# Altium footprint library myPcb.PcbLib: 145 footprints (part 5 of 10)
Each footprint in its own frame and in the unit in brackets; x right, y up, seen from the top. Pads: shape width x height; smd on the part's side, far side on the other; paste and mask are expansions set on the pad; w line width, h text height; cw(c..) or ccw(c..) is an arc to the next point about the centre after c.
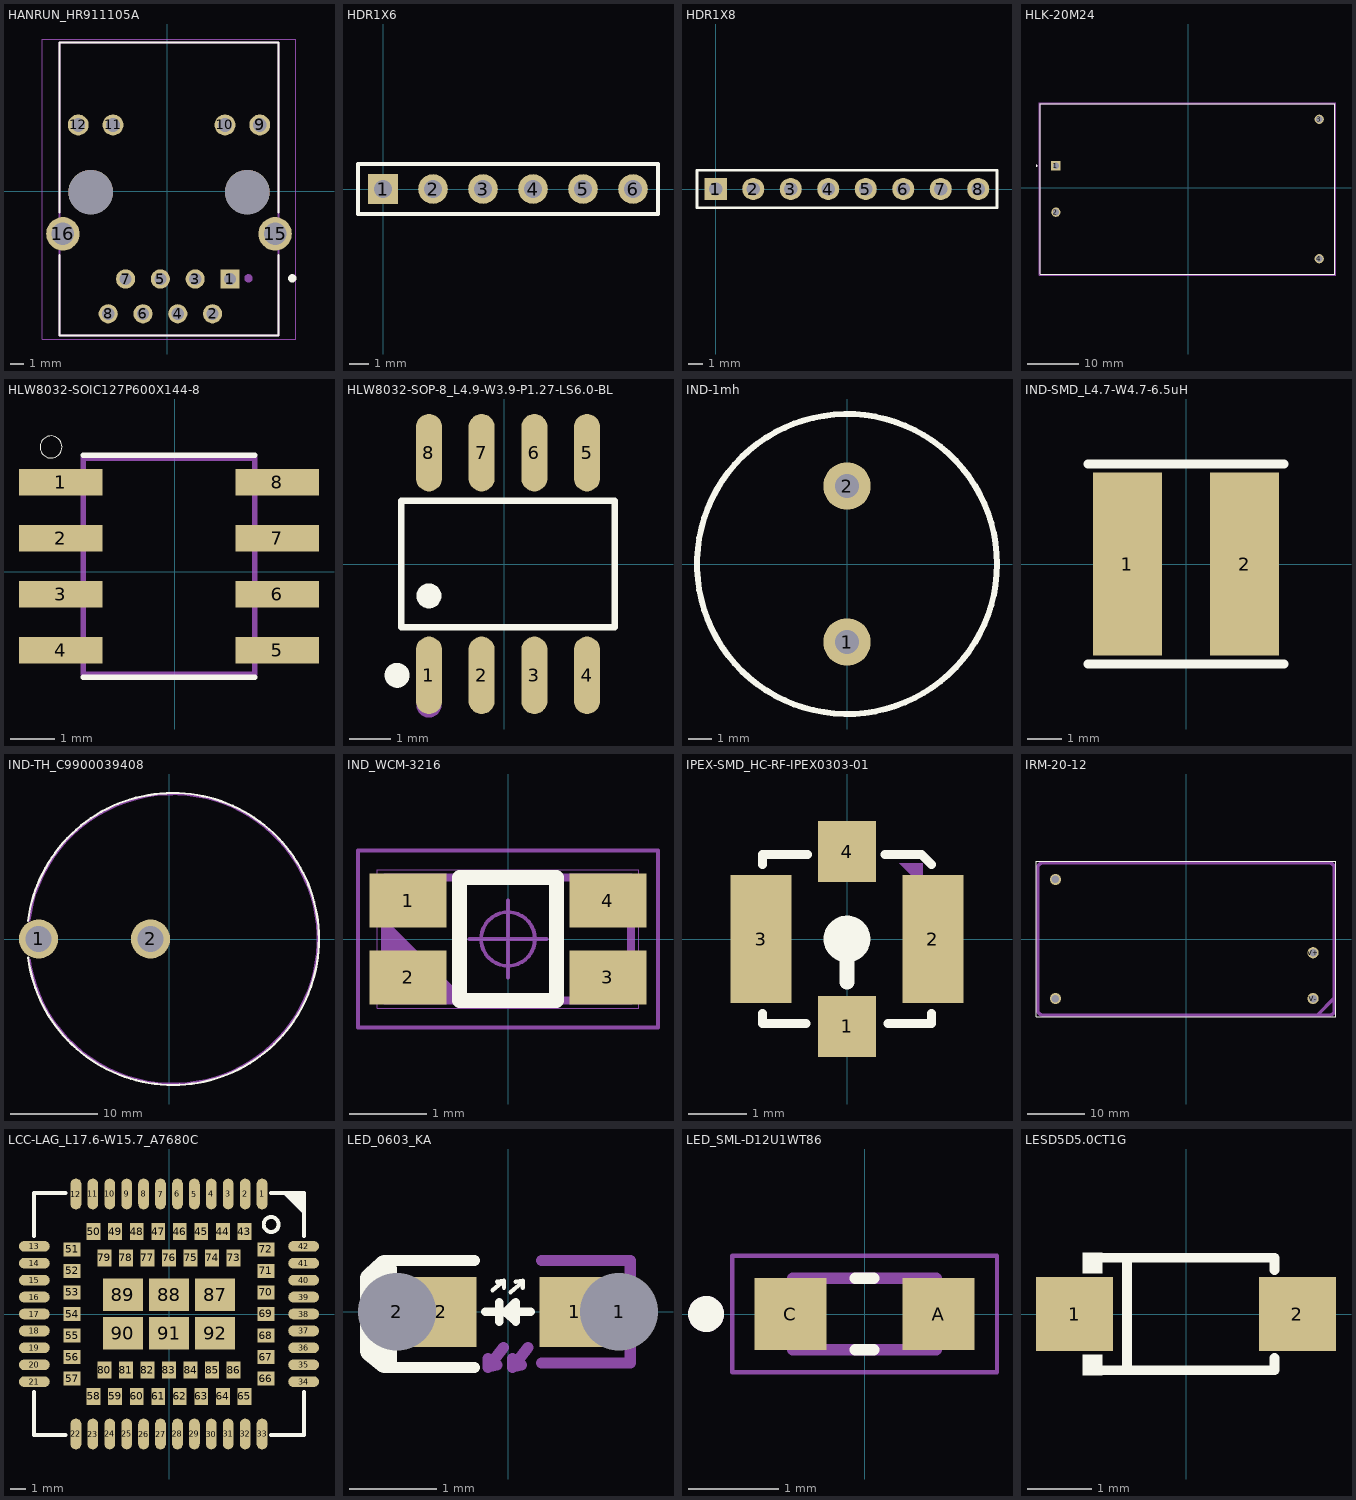
[diagram p4: the footprints below, top view; thin cyan lines are the x and y axes]

## HANRUN_HR911105A [mm] "带变压器以太网接口Hanrun"
pads (16):
  rect 1.398x1.398 / inner round 1.398 / far side rect 1.398x1.398 hole 0.89: 1(4.577,-6.393)
  round 1.398 hole 0.89: 2(3.307,-8.933) 3(2.037,-6.393) 4(0.767,-8.933) 5(-0.503,-6.393) 6(-1.773,-8.933) 7(-3.043,-6.393) 8(-4.313,-8.933)
  round 1.53 hole 1.02: 9(6.752,4.857) 10(4.212,4.857) 11(-3.958,4.857) 12(-6.498,4.857)
  round 2.445 hole 1.63: 15(7.872,-3.093) 16(-7.618,-3.093)
  round 3.25 hole 3.25 unplated: ""(-5.588,-0.043) ""(5.842,-0.043)
Top Overlay:
  circle w0.3: c9.127,-6.343 r0.15
  lines w0.127: -7.873,-4.643 -7.873,-10.523 8.127,-10.523 8.127,-4.643 ; -7.873,-1.543 -7.873,10.877 8.127,10.877 8.127,-1.543
Mechanical 13:
  circle w0.3: c5.927,-6.343 r0.15
  lines w0.127: -7.873,-10.523 8.127,-10.523 8.127,10.877 -7.873,10.877 -7.873,-10.523
Mechanical 15:
  lines w0.05: -9.123,-10.773 9.377,-10.773 9.377,11.127 -9.123,11.127 -9.123,-10.773

## HDR1X6 [mm] "Connector; Header; 6 Position,2.54mm"
pads (6):
  rect 1.5x1.5 hole 0.9: 1(0,0)
  round 1.5 hole 0.9: 2(2.54,0) 3(5.08,0) 4(7.62,0) 5(10.16,0) 6(12.7,0)
Top Overlay:
  lines w0.2: -1.27,-1.27 13.97,-1.27 13.97,1.27 -1.27,1.27 -1.27,-1.27

## HDR1X8 [mm] "Connector; Header; 8 Position,2.54mm"
pads (8):
  rect 1.5x1.5 hole 0.9: 1(0,0)
  round 1.5 hole 0.9: 2(2.54,0) 3(5.08,0) 4(7.62,0) 5(10.16,0) 6(12.7,0) 7(15.24,0) 8(17.78,0)
Top Overlay:
  lines w0.2: -1.27,-1.27 -1.27,1.27 19.05,1.27 19.05,-1.27 -1.27,-1.27

## HLK-20M24 [mm] "AC-DC Power Module"
pads (4):
  rect 1.8x1.8 hole 1.2: 1(-25.627,4.246)
  round 1.8 hole 1.2: 2(-25.627,-4.754) 3(25.373,13.246) 4(25.373,-13.754)
Top Overlay:
  circle w0.2: c-29.377,4.246 r0.1
  lines w0.127: -28.627,-16.754 -28.627,16.246 28.373,16.246 28.373,-16.754 -28.627,-16.754
Mechanical 13:
  circle w0.2: c-29.377,4.246 r0.1
  lines w0.127: -28.627,-16.754 -28.627,16.246 28.373,16.246 28.373,-16.754 -28.627,-16.754
Mechanical 15:
  lines w0.05: -28.877,-17.004 -28.877,16.496 28.623,16.496 28.623,-17.004 -28.877,-17.004
3D body "step_temp.STEP": height 22.5, standoff -5, extent -28.627,-16.754 28.373,16.246

## HLW8032-SOIC127P600X144-8 [mil] "HLW8032"
pads (8):
  rect 74.84x23.59 smd: 1(-101.67,80) 2(-101.67,30) 3(-101.67,-20) 4(-101.67,-70) 5(91.67,-70) 6(91.67,-20) 7(91.67,30) 8(91.67,80)
Top Overlay:
  circle w0: c-110.43,111.64 r9.84
  lines w4.72: -81.77,-94.16 71.77,-94.16 ; -81.77,104.16 71.77,104.16
Mechanical 13:
  lines w4.72: -81.77,-91.46 71.77,-91.46 71.77,101.46 -81.77,101.46 -81.77,-91.46

## HLW8032-SOP-8_L4.9-W3.9-P1.27-LS6.0-BL [mm] "HLW8032"
pads (8):
  oval 0.63x1.865 smd paste+0 mask+0.051: 1(-1.82,-2.682) 2(-0.55,-2.682) 3(0.72,-2.682) 4(1.99,-2.682) 5(1.99,2.682) 6(0.72,2.682) 7(-0.55,2.682) 8(-1.82,2.682)
Top Overlay:
  circle w0.3: c-2.587,-2.682 r0.15
  circle w0.3: c-1.82,-0.769 r0.15
  lines w0.152: -2.491,-1.521 2.661,-1.521 2.661,1.521 -2.491,1.521 -2.491,-1.521
Mechanical 15:
  circle w0.3: c-1.82,-3.4 r0.15

## IND-1mh [mm] "工字电感 1mh"
pads (2):
  round 2 hole 1 paste+0 mask+0.051: 1(0,-3.302) 2(0,3.302)
Top Overlay:
  circle w0.254: c0,0 r6.35

## IND-SMD_L4.7-W4.7-6.5uH [mm] "6.5uH"
pads (2):
  rect 2x5.3 smd paste+0 mask+0.051: 1(-1.7,0) 2(1.7,0)
Top Overlay:
  lines w0.254: -2.85,-2.9 2.85,-2.9 ; -2.85,2.9 2.85,2.9

## IND-TH_C9900039408 [mm] "1mh 0510 色环电感 立式安装"
pads (2):
  round 4.5 hole 3 paste+0 mask+0.05: 1(-14.973,0) 2(-2.123,0)
Top Overlay:
  lines w0.254: -16.181,2.079 cw(c0.452,0) -16.173,-2.147
Mechanical 15:
  drawing of 1 lines, arcs and shapes, not listed

## IND_WCM-3216 [mm] "WCM-3216-222T"
pads (4):
  rect 1x0.7 smd: 1(-1.3,0.5) 2(-1.3,-0.5) 3(1.3,-0.5) 4(1.3,0.5)
Top Overlay:
  lines w0.2: -0.63,-0.8 0.63,-0.8 0.63,0.8 -0.63,0.8 -0.63,-0.8
Top Assembly:
  lines w0.1: -1.6,-0.7 -1.5,-0.8 ; -1.6,-0.6 -1.4,-0.8 ; -1.6,-0.5 -1.3,-0.8 ; -1.6,-0.4 -1.2,-0.8 ; -1.6,-0.3 -1.1,-0.8 ; -1.6,-0.2 -1,-0.8 ; -1.6,-0.1 -0.9,-0.8 ; -1.6,0 -0.8,-0.8 ; -1.6,0.1 -0.7,-0.8 ; -1.6,0.2 -0.6,-0.8 ; -1.6,-0.8 1.6,-0.8 1.6,0.8 -1.6,0.8 -1.6,-0.8
Mechanical 18:
  circle w0.05: c0,0 r0.35
  lines w0.05: -0.5,0 0.5,0 ; 0,-0.5 0,0.5 ; -1.95,-1.15 1.95,-1.15 1.95,1.15 -1.95,1.15 -1.95,-1.15
Mechanical 19:
  lines w0.001: -1.7,-0.9 1.7,-0.9 1.7,0.9 -1.7,0.9 -1.7,-0.9

## IPEX-SMD_HC-RF-IPEX0303-01 [mm]
pads (4):
  rect 1x1.05 smd paste+0 mask+0.05: 1(0,-1.5) 4(0,1.5)
  rect 1.05x2.2 smd paste+0 mask+0.05: 2(1.475,0) 3(-1.475,0)
Top Overlay:
  circle w0.4: c0,0 r0.2
  lines w0.152: -1.45,-1.28 -1.45,-1.3 -1.45,-1.45 -0.701,-1.45 ; -1.45,1.28 -1.45,1.4 -1.45,1.45 -1.4,1.45 -0.68,1.45 ; 0.65,1.45 1.1,1.45 1.28,1.45 1.45,1.28 1.447,1.28 1.277,1.45 ; 0.701,-1.45 1.097,-1.45 1.45,-1.45 1.45,-1.3 1.45,-1.28
  lines w0.254: 0,-0.744 0,-0.3
Mechanical 15:
  circle w0.4: c0,-1.45 r0.2
  region: 1.3,0.9 1.3,1.3 0.9,1.3

## IRM-20-12 [mm]
pads (4):
  round 1.95 hole 1.3: AC/L(-22.8,10.4) AC/N(-22.8,-10.4) V+(22.2,-2.4) V-(22.2,-10.4)
Top Overlay:
  lines w0.127: -26.2,-13.6 26.2,-13.6 26.2,13.6 -26.2,13.6 -26.2,-13.6
Mechanical 13:
  lines w0.61: -25.9,-12.4 ccw(c-25,-12.4) -25,-13.3 ; -25.9,-12.4 ccw(c-25,-12.4) -25,-13.3 ; -25.9,-12.4 -25.9,12.4 ; -25.9,12.4 cw(c-25,12.4) -25,13.3 ; -25.9,12.4 cw(c-25,12.4) -25,13.3 ; -25,-13.3 22.9,-13.3 ; -25,13.3 25,13.3 ; 22.9,-13.3 25.1,-13.3 ; 22.9,-13.3 25.9,-10.3 ; 25,13.3 cw(c25,12.4) 25.9,12.4 ; 25,13.3 cw(c25,12.4) 25.9,12.4 ; 25.1,-13.3 ccw(c25.1,-12.5) 25.9,-12.5 ; 25.1,-13.3 ccw(c25.1,-12.5) 25.9,-12.5 ; 25.9,-12.5 25.9,-10.3 ; 25.9,-10.3 25.9,12.4

## LCC-LAG_L17.6-W15.7_A7680C [mm] "A7680C"
pads (92):
  oval 0.7x2 smd paste+0 mask+0.051: 1(6.05,7.8) 2(4.95,7.8) 3(3.85,7.8) 4(2.75,7.8) 5(1.65,7.8) 6(0.55,7.8) 7(-0.55,7.8) 8(-1.65,7.8) 9(-2.75,7.8) 10(-3.85,7.8) 11(-4.95,7.8) 12(-6.05,7.8) 22(-6.05,-7.8) 23(-4.95,-7.8) 24(-3.85,-7.8) 25(-2.75,-7.8) 26(-1.65,-7.8) 27(-0.55,-7.8) 28(0.55,-7.8) 29(1.65,-7.8) 30(2.75,-7.8) 31(3.85,-7.8) 32(4.95,-7.8) 33(6.05,-7.8)
  oval 2x0.7 smd paste+0 mask+0.051: 13(-8.75,4.4) 14(-8.75,3.3) 15(-8.75,2.2) 16(-8.75,1.1) 17(-8.75,0) 18(-8.75,-1.1) 19(-8.75,-2.2) 20(-8.75,-3.3) 21(-8.75,-4.4) 34(8.75,-4.4) 35(8.75,-3.3) 36(8.75,-2.2) 37(8.75,-1.1) 38(8.75,0) 39(8.75,1.1) 40(8.75,2.2) 41(8.75,3.3) 42(8.75,4.4)
  rect 0.9x1.1 smd paste+0 mask+0.051: 43(4.9,5.35) 44(3.5,5.35) 45(2.1,5.35) 46(0.7,5.35) 47(-0.7,5.35) 48(-2.1,5.35) 49(-3.5,5.35) 50(-4.9,5.35) 58(-4.9,-5.35) 59(-3.5,-5.35) 60(-2.1,-5.35) 61(-0.7,-5.35) 62(0.7,-5.35) 63(2.1,-5.35) 64(3.5,-5.35) 65(4.9,-5.35) 73(4.2,3.65) 74(2.8,3.65) 75(1.4,3.65) 76(0,3.65) 77(-1.4,3.65) 78(-2.8,3.65) 79(-4.2,3.65) 80(-4.2,-3.65) 81(-2.8,-3.65) 82(-1.4,-3.65) 83(0,-3.65) 84(1.4,-3.65) 85(2.8,-3.65) 86(4.2,-3.65)
  rect 1.1x0.9 smd paste+0 mask+0.051: 51(-6.3,4.2) 52(-6.3,2.8) 53(-6.3,1.4) 54(-6.3,0) 55(-6.3,-1.4) 56(-6.3,-2.8) 57(-6.3,-4.2) 66(6.3,-4.2) 67(6.3,-2.8) 68(6.3,-1.4) 69(6.3,0) 70(6.3,1.4) 71(6.3,2.8) 72(6.3,4.2)
  rect 2.6x2.1 smd paste+0 mask+0.051: 87(3,1.25) 88(0,1.25) 89(-3,1.25) 90(-3,-1.25) 91(0,-1.25) 92(3,-1.25)
Top Overlay:
  region: 8.763,6.477 8.763,7.874 7.366,7.874
  lines w0.254: -8.763,-5.08 -8.763,-7.874 -6.731,-7.874 ; -8.763,5.08 -8.763,7.874 -6.731,7.874 ; 6.631,-7.874 8.763,-7.874 8.763,-5.08 ; 6.631,7.874 8.763,7.874 8.763,5.08 ; 7.125,5.813 cw(c6.641,5.818) 7.125,5.818
Top Paste:
  region: 4.3,0.2 1.7,0.2 1.7,2.3 3.5,2.3 4.3,1.45
Top Solder:
  region: 4.3,0.2 1.7,0.2 1.7,2.3 3.5,2.3 4.3,1.45
Mechanical 1:
  region: 8.763,6.477 8.763,7.874 7.366,7.874

## LED_0603_KA [mil]
pads (4):
  rect 31.5x31.5 smd paste+0 mask+2: 1(30,0) 2(-30,0)
  round 30 hole 35 paste+0 mask+1.97: 1(50,0) 2(-50,0)
Top Overlay:
  lines w1.97: -7,9.67 -1.88,14 ; -4.97,13.57 -1.82,13.96 -1.82,10.81 ; 1.15,8.84 6.27,13.17 ; 3.51,13.57 6.66,13.96 6.66,10.81
  lines w3.94: -10.24,0 10.24,0 ; -3.94,-4.33 -3.94,4.33 ; -0.79,-0.39 3.54,-4.33 3.54,4.33 -0.39,0.39
  lines w5: -55,-25 -15,-25 ; -55,23 -15,23
  lines w10: -61.5,15 -61.5,-17.5 -55.5,-22.5 ; -61,15.5 -55.5,20.5 ; -55,-22 -55,19
Mechanical 6:
  lines w5: -9,-21 -9,-25 ; -5,-24 -9,-25 ; -2,-16 -9,-25 ; 2,-21 2,-25 ; 6,-24 2,-25 ; 9,-16 2,-25 ; 15,-23 55,-23 55,23 15,23

## LED_SML-D12U1WT86 [mm]
height 0.65
pads (2):
  rect 0.8x0.8 smd: A(0.825,0) C(-0.825,0)
Top Overlay:
  circle w0.2: c-1.765,0 r0.1
  lines w0.127: -0.105,-0.4 0.105,-0.4 ; -0.105,0.4 0.105,0.4
Mechanical 13:
  circle w0.2: c-1.765,0 r0.1
  lines w0.127: -0.8,-0.4 -0.8,0.4 0.8,0.4 0.8,-0.4 -0.8,-0.4
Mechanical 15:
  lines w0.05: -1.475,-0.65 -1.475,0.65 1.475,0.65 1.475,-0.65 -1.475,-0.65
3D body "step_temp.STEP": height 0.55, standoff 0, extent -0.8,-0.4 0.8,0.4

## LESD5D5.0CT1G [mm]
pads (2):
  rect 1.2x1.15 smd paste+0 mask+0.051: 1(-1.735,0) 2(1.735,0)
Top Overlay:
  region: -1.3,-0.952 -1.3,-0.632 -1.605,-0.632 -1.605,-0.952
  region: -1.3,0.952 -1.3,0.632 -1.605,0.632 -1.605,0.952
  lines w0.152: -1.376,-0.876 1.376,-0.876 1.376,-0.683 ; -1.376,0.876 1.376,0.876 1.376,0.683 ; -0.917,-0.876 -0.917,0.876
Mechanical 15:
  region: 1.747,-0.384 1.555,-0.384 1.555,0.384 1.747,0.384
  region: 2.035,0.096 2.035,-0.096 1.267,-0.096 1.267,0.096
  region: -2.032,0.127 -2.032,-0.065 -1.264,-0.065 -1.264,0.127